# Altium footprint library PCBLIB.PcbLib: 557 footprints (part 19 of 36)
Each footprint in its own frame and in the unit in brackets; x right, y up, seen from the top. Pads: shape width x height; smd on the part's side, far side on the other; paste and mask are expansions set on the pad; w line width, h text height; cw(c..) or ccw(c..) is an arc to the next point about the centre after c.
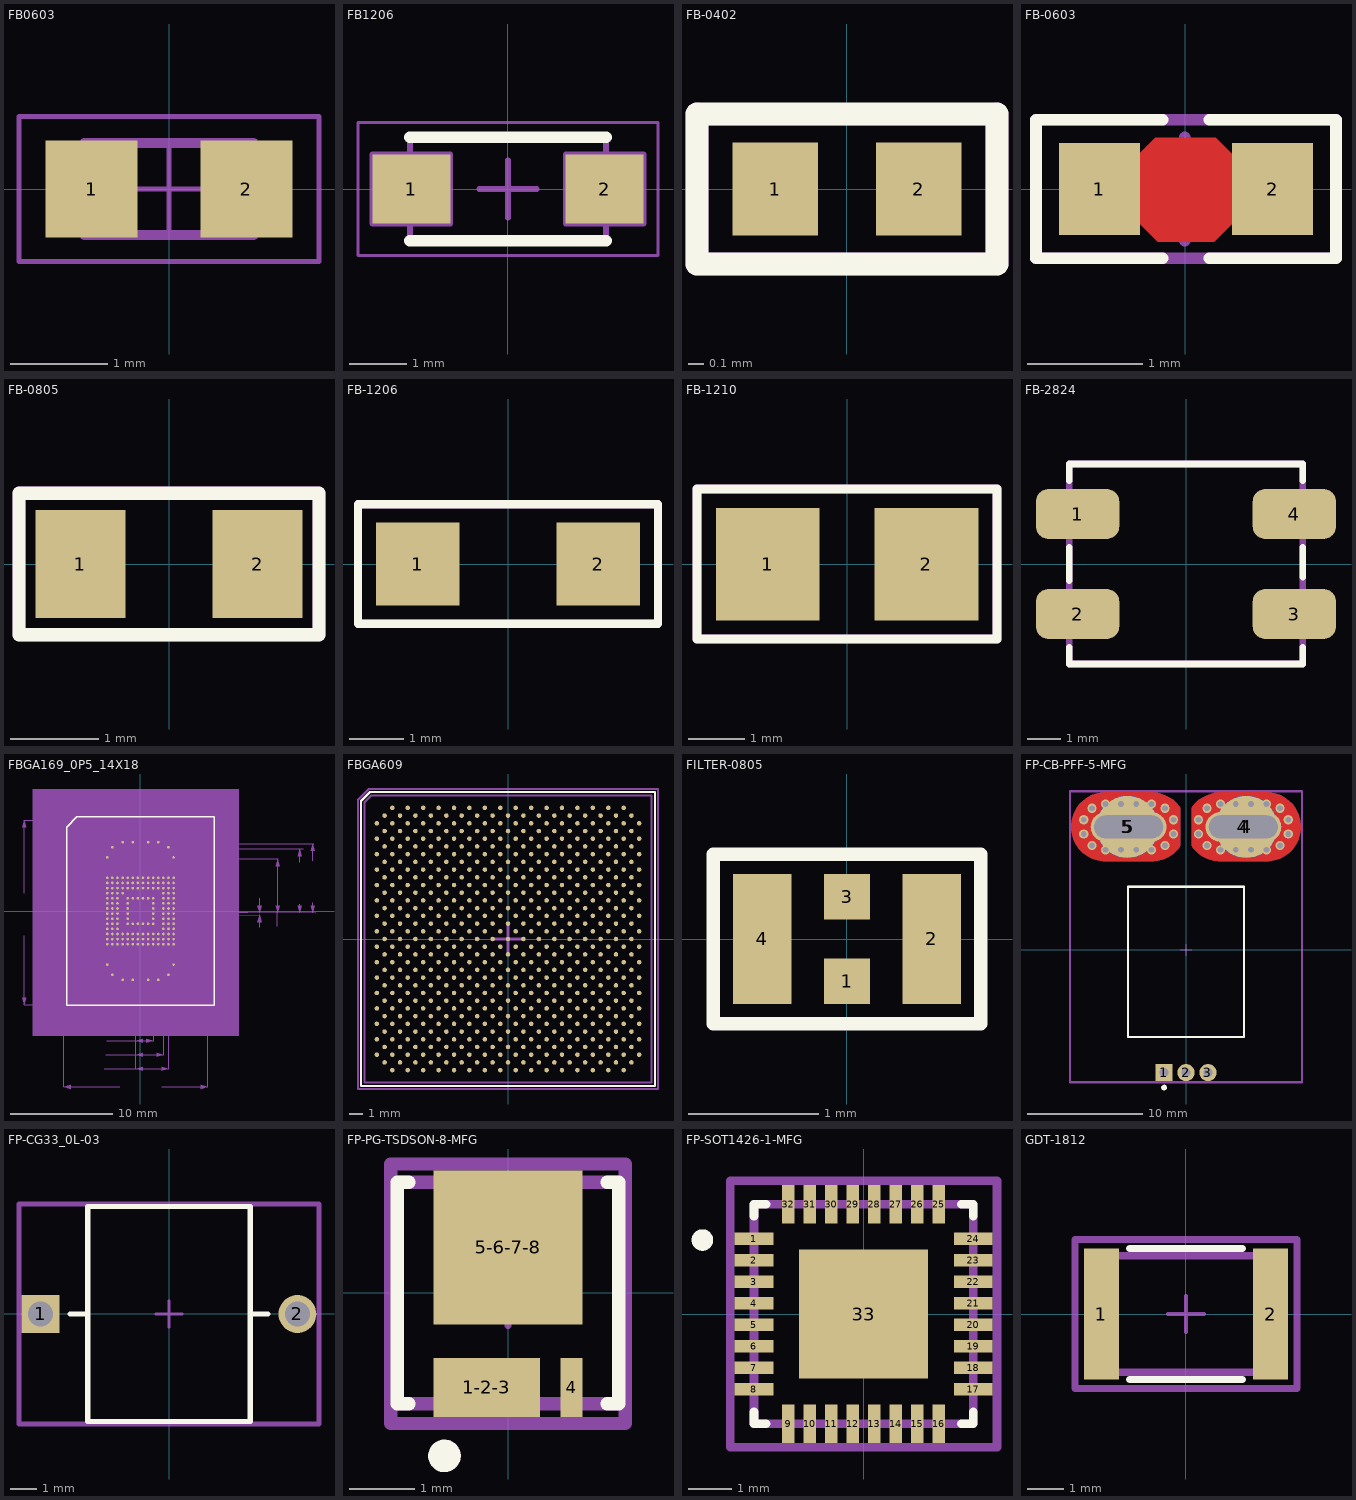
[diagram p18: the footprints below, top view; thin cyan lines are the x and y axes]

## FB0603 [mm] "Chip Inductor, 2-Leads, EIA 0603, Metric 1608, Body 1.6x0.8mm, IPC Medium Density"
height 0.95
pads (2):
  rect 0.95x1 smd: 1(-0.8,0) 2(0.8,0)
Mechanical 14:
  lines w0.1: -0.875,-0.475 -0.875,0.475 0.875,0.475 0.875,-0.475 -0.875,-0.475
Mechanical 15:
  lines w0.05: -0.5,0 0.5,0 ; 0,-0.5 0,0.5 ; -1.55,-0.75 -1.55,0.75 1.55,0.75 1.55,-0.75 -1.55,-0.75
3D body "INDC1608X95N.stp": height 0.95, standoff -0.05, extent -0.875,-0.475 0.875,0.475

## FB1206 [mm] "Chip Ferrite Bead, 3.20mm L X 1.60mm W, BLM31PG Series"
height 1.3
pads (2):
  rect 1.35x1.2 smd: 1(-1.675,0) 2(1.675,0)
Top Overlay:
  lines w0.2: -1.7,-0.9 1.7,-0.9 ; -1.7,0.9 1.7,0.9
Mechanical 8:
  lines w0.1: -2.175,0 -1.675,0 ; -1.675,-0.5 -1.675,0 ; -1.675,0.5 -1.675,0 ; -1.175,0 -1.675,0 ; -0.5,0 0,0 ; 0,-0.5 0,0 ; 0,0.5 0,0 ; 0.5,0 0,0 ; 1.175,0 1.675,0 ; 1.675,-0.5 1.675,0 ; 1.675,0.5 1.675,0 ; 2.175,0 1.675,0 ; -2.35,-0.6 -2.35,0.6 -1,0.6 -1,-0.6 -2.35,-0.6 ; 1,-0.6 1,0.6 2.35,0.6 2.35,-0.6 1,-0.6
Mechanical 14:
  lines w0.1: -1.7,-0.9 1.7,-0.9 1.7,0.9 -1.7,0.9 -1.7,-0.9
Mechanical 15:
  lines w0.05: -2.6,-1.15 2.6,-1.15 2.6,1.15 -2.6,1.15 -2.6,-1.15
3D body "IND_MURATA_BLM31PG.stp": height 1.3, standoff 0, extent -1.6,-0.8 1.6,0.8

## FB-0402 [mm]
pads (2):
  rect 0.57x0.62 smd mask+0.05: 1(-0.48,0) 2(0.48,0)
Top Overlay:
  lines w0.152: -1,-0.5 -1,0.5 1,0.5 1,-0.5 -1,-0.5
ASM Top:
  lines w0.15: -1,0.5 1,0.5
  lines w0.152: -1,0.5 -1,-0.5 1,-0.5 1,0.5
  text ".designator" at 0,0 h0.8
3D body "C_0402.step": height 0.5, standoff 0, extent -0.5,-0.25 0.5,0.25

## FB-0603 [mm]
pads (2):
  rect 0.7x0.8 smd: 1(-0.744,0) 2(0.756,0)
Top Layer:
  pour cut-out: -0.262,0.444 -0.394,0.311 -0.394,-0.3 -0.238,-0.456 0.249,-0.456 0.406,-0.3 0.406,0.3 0.262,0.444
Top Overlay:
  lines w0.1: -0.194,-0.6 -1.294,-0.6 -1.294,0.6 -0.194,0.6 ; 0.206,-0.6 1.306,-0.6 1.306,0.6 0.206,0.6
Mechanical 15:
  lines w0.1: -0.45,0 0.45,0 ; -0.006,-0.45 -0.006,0.45
ASM Top:
  lines w0.1: -1.294,-0.6 1.306,-0.6 1.306,0.6 -1.294,0.6 -1.294,-0.6
  text ".designator" at -0.006,-0.08 h0.8
3D body "C_0603.step": height 0.78, standoff 0, extent -0.8,-0.405 0.8,0.405

## FB-0805 [mil]
pads (2):
  rect 40x48 smd mask+1.97: 1(-39.5,0) 2(39.5,0)
Top Overlay:
  lines w6: -66.93,-31.5 -66.93,31.5 66.93,31.5 66.93,-31.5 -66.93,-31.5
ASM Top:
  lines w6: -66.93,-31.5 66.93,-31.5 66.93,31.5 -66.93,31.5 -66.93,-31.5
  text ".designator" at -55,-20 h31.5
3D body "C_0805.step": height 30.71, standoff 0, extent -40.36,-24.6 38.38,24.61

## FB-1206 [mil]
pads (2):
  rect 60x60 smd mask+1.97: 1(-65,0) 2(65,0)
Top Overlay:
  lines w6: -108,-43 -108,43 108,43 108,-43 -108,-43
ASM Top:
  lines w6: -108,-43 -108,43 108,43 108,-43 -108,-43
  text ".designator" at -90,-25 h31.5
3D body "C_1206.step": height 30.71, standoff 0, extent -62.03,-29.91 58.04,29.93

## FB-1210 [mil]
pads (2):
  rect 72x78 smd mask+1.97: 1(-55,0) 2(55,0)
Top Overlay:
  lines w6: -104,-52 -104,52 104,52 104,-52 -104,-52
ASM Top:
  lines w6: -104,-52 104,-52 104,52 -104,52 -104,-52
  text ".designator" at -86,-33 h31.5
3D body "C_1210.step": height 98.43, standoff 0, extent -62.99,-49 62.99,49.43

## FB-2824 [mm]
pads (4):
  rrect50% 2.5x1.5 smd: 1(-3.25,1.5) 2(-3.25,-1.5) 3(3.25,-1.5) 4(3.25,1.5)
Top Overlay:
  lines w0.2: -3.5,-2.5 -3.5,-3 3.5,-3 3.5,-2.5 ; -3.5,-0.5 -3.5,-0.4 -3.5,0.5 ; -3.5,2.5 -3.5,3 3.5,3 3.5,2.5 ; 3.5,-0.4 3.5,0.5
ASM Top:
  lines w0.2: -3.5,-3 -3.5,3 3.5,3 3.5,-3 -3.5,-3 ; -3.5,-3 -3.5,-3
  text ".designator" at -0.9,0 h0.8
3D body "acm7060.step": height 3.36, standoff 0.01, extent -3.5,-3 3.5,3

## FBGA169_0P5_14X18 [mil] "FBGA169_0P5_14X18"
pads (169):
  round 10 smd: A4(-68.9,265.75) A6(-29.53,265.75) A9(29.53,265.75) A11(68.9,265.75) AA1(-127.95,-127.95) AA2(-108.27,-127.95) AA3(-88.58,-127.95) AA4(-68.9,-127.95) AA5(-49.21,-127.95) AA6(-29.53,-127.95) AA7(-9.84,-127.95) AA8(9.84,-127.95) AA9(29.53,-127.95) AA10(49.21,-127.95) AA11(68.9,-127.95) AA12(88.58,-127.95) AA13(108.27,-127.95) AA14(127.95,-127.95) AE1(-127.95,-206.69) AE14(127.95,-206.69) AG2(-108.27,-246.06) AG13(108.27,-246.06) AH4(-68.9,-265.75) AH6(-29.53,-265.75) AH9(29.53,-265.75) AH11(68.9,-265.75) B2(-108.27,246.06) B13(108.27,246.06) D1(-127.95,206.69) D14(127.95,206.69) H1(-127.95,127.95) H2(-108.27,127.95) H3(-88.58,127.95) H4(-68.9,127.95) H5(-49.21,127.95) H6(-29.53,127.95) H7(-9.84,127.95) H8(9.84,127.95) H9(29.53,127.95) H10(49.21,127.95) H11(68.9,127.95) H12(88.58,127.95) H13(108.27,127.95) H14(127.95,127.95) J1(-127.95,108.27) J2(-108.27,108.27) J3(-88.58,108.27) J4(-68.9,108.27) J5(-49.21,108.27) J6(-29.53,108.27) J7(-9.84,108.27) J8(9.84,108.27) J9(29.53,108.27) J10(49.21,108.27) J11(68.9,108.27) J12(88.58,108.27) J13(108.27,108.27) J14(127.95,108.27) K1(-127.95,88.58) K2(-108.27,88.58) K3(-88.58,88.58) K4(-68.9,88.58) K5(-49.21,88.58) K6(-29.53,88.58) K7(-9.84,88.58) K8(9.84,88.58) K9(29.53,88.58) K10(49.21,88.58) K11(68.9,88.58) K12(88.58,88.58) K13(108.27,88.58) K14(127.95,88.58) L1(-127.95,68.9) L2(-108.27,68.9) L3(-88.58,68.9) L4(-68.9,68.9) L12(88.58,68.9) L13(108.27,68.9) L14(127.95,68.9) M1(-127.95,49.21) M2(-108.27,49.21) M3(-88.58,49.21) M5(-49.21,49.21) M6(-29.53,49.21) M7(-9.84,49.21) M8(9.84,49.21) M9(29.53,49.21) M10(49.21,49.21) M12(88.58,49.21) M13(108.27,49.21) M14(127.95,49.21) N1(-127.95,29.53) N2(-108.27,29.53) N3(-88.58,29.53) N5(-49.21,29.53) N10(49.21,29.53) N12(88.58,29.53) N13(108.27,29.53) N14(127.95,29.53) P1(-127.95,9.84) P2(-108.27,9.84) P3(-88.58,9.84) P5(-49.21,9.84) P10(49.21,9.84) P12(88.58,9.84) P13(108.27,9.84) P14(127.95,9.84) R1(-127.95,-9.84) R2(-108.27,-9.84) R3(-88.58,-9.84) R5(-49.21,-9.84) R10(49.21,-9.84) R12(88.58,-9.84) R13(108.27,-9.84) R14(127.95,-9.84) T1(-127.95,-29.53) T2(-108.27,-29.53) T3(-88.58,-29.53) T5(-49.21,-29.53) T10(49.21,-29.53) T12(88.58,-29.53) T13(108.27,-29.53) T14(127.95,-29.53) U1(-127.95,-49.21) U2(-108.27,-49.21) U3(-88.58,-49.21) U5(-49.21,-49.21) U6(-29.53,-49.21) U7(-9.84,-49.21) U8(9.84,-49.21) U9(29.53,-49.21) U10(49.21,-49.21) U12(88.58,-49.21) U13(108.27,-49.21) U14(127.95,-49.21) V1(-127.95,-68.9) V2(-108.27,-68.9) V3(-88.58,-68.9) V12(88.58,-68.9) V13(108.27,-68.9) V14(127.95,-68.9) W1(-127.95,-88.58) W2(-108.27,-88.58) W3(-88.58,-88.58) W4(-68.9,-88.58) W5(-49.21,-88.58) W6(-29.53,-88.58) W7(-9.84,-88.58) W8(9.84,-88.58) W9(29.53,-88.58) W10(49.21,-88.58) W11(68.9,-88.58) W12(88.58,-88.58) W13(108.27,-88.58) W14(127.95,-88.58) Y1(-127.95,-108.27) Y2(-108.27,-108.27) Y3(-88.58,-108.27) Y4(-68.9,-108.27) Y5(-49.21,-108.27) Y6(-29.53,-108.27) Y7(-9.84,-108.27) Y8(9.84,-108.27) Y9(29.53,-108.27) Y10(49.21,-108.27) Y11(68.9,-108.27) Y12(88.58,-108.27) Y13(108.27,-108.27) Y14(127.95,-108.27)
Top Overlay:
  lines w5: -284.56,-363.3 -284.57,323.93 -245.2,363.3 284.56,363.3 284.56,-363.31 -284.56,-363.3
Bottom 3D Body (Mech9):
  lines w1: -28.16,-5.5 -8.08,-5.5 ; -18.12,-15.54 -18.12,4.54
Mechanical 15:
  circle w6: c-244.88,306.5 r19.64
  lines w6: -277.56,-356.3 277.56,-356.3 277.56,356.3 -238.19,356.3 -277.56,316.93 -277.56,-356.3
Mechanical 45:
  pour cut-out: 379.44,470.8 -415.68,470.8 -415.68,-481.8 379.44,-481.8
Mechanical 46:
  text "T10" at -79.33,24.03 h10
  text "U9" at -55.65,43.71 h10
  text "M6" at 3.41,-54.71 h10
  text "N5" at 23.09,-35.03 h10
  text "AA5" at 19.09,122.45 h10
  text "AA3" at 58.46,122.45 h10
  text "Y4" at 42.78,102.77 h10
  text "W4" at 42.78,83.08 h10
  text "K6" at 3.41,-94.08 h10
  text "J6" at 3.41,-113.77 h10
  text "W5" at 23.09,83.08 h10
  text "K2" at 82.15,-94.08 h10
  text "H3" at 62.46,-133.45 h10
  text "R5" at 23.09,4.34 h10
  text "H4" at 42.78,-133.45 h10
  text "H5" at 23.09,-133.45 h10
  text "J2" at 82.15,-113.77 h10
  text "J3" at 62.46,-113.77 h10
  text "J4" at 42.78,-113.77 h10
  text "W6" at 3.41,83.08 h10
  text "J5" at 23.09,-113.77 h10
  text "Y5" at 23.09,102.77 h10
  text "T5" at 23.09,24.03 h10
  text "P5" at 23.09,-15.34 h10
  text "M7" at -16.28,-54.71 h10
  text "R10" at -79.33,4.34 h10
  text "U8" at -35.96,43.71 h10
  text "K4" at 42.78,-94.08 h10
  text "H6" at 3.41,-133.45 h10
  text "Y2" at 82.15,102.77 h10
  text "AA6" at -0.59,122.45 h10
  text "AA4" at 38.78,122.45 h10
  text "U7" at -16.28,43.71 h10
  text "U6" at 3.41,43.71 h10
  text "U10" at -79.33,43.71 h10
  text "P3" at 62.46,-15.34 h10
  text "P10" at -79.33,-15.34 h10
  text "N10" at -79.33,-35.03 h10
  text "M9" at -55.65,-54.71 h10
  text "M8" at -35.96,-54.71 h10
  text "M5" at 23.09,-54.71 h10
  text "M10" at -79.33,-54.71 h10
  text "K5" at 23.09,-94.08 h10
  text "H7" at -16.28,-133.45 h10
  text "AA10" at -83.33,122.45 h10
  text "Y9" at -55.65,102.77 h10
  text "Y8" at -35.96,102.77 h10
  text "Y7" at -16.28,102.77 h10
  text "Y6" at 3.41,102.77 h10
  text "Y3" at 62.46,102.77 h10
  text "Y14" at -158.07,102.77 h10
  text "Y13" at -138.39,102.77 h10
  text "Y12" at -118.7,102.77 h10
  text "Y11" at -99.02,102.77 h10
  text "Y10" at -79.33,102.77 h10
  text "Y1" at 101.83,102.77 h10
  text "W9" at -55.65,83.08 h10
  text "W8" at -35.96,83.08 h10
  text "W7" at -16.28,83.08 h10
  text "W3" at 62.46,83.08 h10
  text "W2" at 82.15,83.08 h10
  text "W14" at -158.07,83.08 h10
  text "W13" at -138.39,83.08 h10
  text "W12" at -118.7,83.08 h10
  text "W11" at -99.02,83.08 h10
  text "W10" at -79.33,83.08 h10
  text "W1" at 101.83,83.08 h10
  text "V3" at 62.46,63.4 h10
  text "V2" at 82.15,63.4 h10
  text "V14" at -158.07,63.4 h10
  text "V13" at -138.39,63.4 h10
  text "V12" at -118.7,63.4 h10
  text "V1" at 101.83,63.4 h10
  text "U3" at 62.46,43.71 h10
  text "U2" at 82.15,43.71 h10
  text "U14" at -158.07,43.71 h10
  text "U13" at -138.39,43.71 h10
  text "U12" at -118.7,43.71 h10
  text "U1" at 101.83,43.71 h10
  text "T3" at 62.46,24.03 h10
  text "T2" at 82.15,24.03 h10
  text "T14" at -158.07,24.03 h10
  text "T13" at -138.39,24.03 h10
  text "T12" at -118.7,24.03 h10
  text "T1" at 101.83,24.03 h10
  text "R3" at 62.46,4.34 h10
  text "R2" at 82.15,4.34 h10
  text "R14" at -158.07,4.34 h10
  text "R13" at -138.39,4.34 h10
  text "R12" at -118.7,4.34 h10
  text "R1" at 101.83,4.34 h10
  text "P2" at 82.15,-15.34 h10
  text "P14" at -158.07,-15.34 h10
  text "P13" at -138.39,-15.34 h10
  text "P12" at -118.7,-15.34 h10
  text "P1" at 101.83,-15.34 h10
  text "N3" at 62.46,-35.03 h10
  text "N2" at 82.15,-35.03 h10
  text "N14" at -158.07,-35.03 h10
  text "N13" at -138.39,-35.03 h10
  text "N12" at -118.7,-35.03 h10
  text "N1" at 101.83,-35.03 h10
  text "M3" at 62.46,-54.71 h10
  text "M2" at 82.15,-54.71 h10
  text "M14" at -158.07,-54.71 h10
  text "M13" at -138.39,-54.71 h10
  text "M12" at -118.7,-54.71 h10
  text "M1" at 101.83,-54.71 h10
  text "L4" at 42.78,-74.4 h10
  text "L3" at 62.46,-74.4 h10
  text "L2" at 82.15,-74.4 h10
  text "L14" at -158.07,-74.4 h10
  text "L13" at -138.39,-74.4 h10
  text "L12" at -118.7,-74.4 h10
  text "L1" at 101.83,-74.4 h10
  text "K9" at -55.65,-94.08 h10
  text "K8" at -35.96,-94.08 h10
  text "K7" at -16.28,-94.08 h10
  text "K3" at 62.46,-94.08 h10
  text "K14" at -158.07,-94.08 h10
  text "K13" at -138.39,-94.08 h10
  text "K12" at -118.7,-94.08 h10
  text "K11" at -99.02,-94.08 h10
  text "K10" at -79.33,-94.08 h10
  text "K1" at 101.83,-94.08 h10
  text "J9" at -55.65,-113.77 h10
  text "J8" at -35.96,-113.77 h10
  text "J7" at -16.28,-113.77 h10
  text "J14" at -158.07,-113.77 h10
  text "J13" at -138.39,-113.77 h10
  text "J12" at -118.7,-113.77 h10
  text "J11" at -99.02,-113.77 h10
  text "J10" at -79.33,-113.77 h10
  text "J1" at 101.83,-113.77 h10
  text "H9" at -55.65,-133.45 h10
  text "H8" at -35.96,-133.45 h10
  text "H2" at 82.15,-133.45 h10
  text "H14" at -158.07,-133.45 h10
  text "H13" at -138.39,-133.45 h10
  text "H12" at -118.7,-133.45 h10
  text "H11" at -99.02,-133.45 h10
  text "H10" at -79.33,-133.45 h10
  text "H1" at 101.83,-133.45 h10
  text "D14" at -158.07,-212.19 h10
  text "D1" at 101.83,-212.19 h10
  text "B2" at 82.15,-251.56 h10
  text "B13" at -138.39,-251.56 h10
  text "AH9" at -59.65,260.25 h10
  text "AH6" at -0.59,260.25 h10
  text "AH4" at 38.78,260.25 h10
  text "AH11" at -103.02,260.25 h10
  text "AG2" at 78.15,240.56 h10
  text "AG13" at -142.39,240.56 h10
  text "AE14" at -162.07,201.19 h10
  text "AE1" at 97.83,201.19 h10
  text "AA9" at -59.65,122.45 h10
  text "AA8" at -39.96,122.45 h10
  text "AA7" at -20.28,122.45 h10
  text "AA2" at 78.15,122.45 h10
  text "AA14" at -162.07,122.45 h10
  text "AA13" at -142.39,122.45 h10
  text "AA12" at -122.7,122.45 h10
  text "AA11" at -103.02,122.45 h10
  text "AA1" at 97.83,122.45 h10
  text "A9" at -55.65,-271.25 h10
  text "A6" at 3.41,-271.25 h10
  text "A4" at 42.78,-271.25 h10
  text "A11" at -99.02,-271.25 h10
  text "U5" at 23.09,43.71 h10
Mechanical 67:
  circle w6: c226.76,-312 r19.64
  lines w6: -63.28,-416.25 -63.28,-391.56 ; 32.75,-419.67 32.75,-394.99 ; 281.17,-103.45 305.86,-103.45 ; 281.17,98.87 305.86,98.87 ; 281.64,197.49 306.33,197.49 ; 282.08,-197.43 306.76,-197.43 ; 282.08,-2.98 306.76,-2.98 ; -295.68,-361.8 220.07,-361.8 259.44,-322.43 259.44,350.8 -295.68,350.8 -295.68,-361.8
  text "U53" at -36.4,-8.44 h20
  text "A" at 289.79,-274.48 h20
  text "AH" at 288.01,280.84 h20
  text "1" at 118.45,-389.16 h20
  text "14" at -139.69,-387.43 h20
Mechanical 106:
  pour cut-out: 231.88,-686.72 259.44,-678.85 231.88,-670.97
  pour cut-out: -268.12,-670.97 -295.68,-678.85 -268.12,-686.72
  pour cut-out: 82.27,-616.64 109.83,-608.77 82.27,-600.89
  pour cut-out: 9.44,-600.89 -18.12,-608.77 9.44,-616.64
  pour cut-out: 62.59,-561.96 90.15,-554.08 62.59,-546.21
  pour cut-out: 9.44,-546.21 -18.12,-554.08 9.44,-561.96
  pour cut-out: 23.22,-508.41 50.78,-500.54 23.22,-492.67
  pour cut-out: 9.44,-492.67 -18.12,-500.54 9.44,-508.41
  pour cut-out: 38.97,-436.8 11.41,-444.67 38.97,-452.55
  pour cut-out: -45.68,-452.55 -18.12,-444.67 -45.68,-436.8
  pour cut-out: 673.14,231.7 665.27,259.26 657.39,231.7
  pour cut-out: 657.39,21.07 665.27,-6.48 673.14,21.07
  pour cut-out: 621.92,212.02 614.05,239.58 606.17,212.02
  pour cut-out: 606.17,21.07 614.05,-6.48 621.92,21.07
  pour cut-out: 537.39,172.65 529.52,200.21 521.64,172.65
  pour cut-out: 521.64,21.07 529.52,-6.48 537.39,21.07
  pour cut-out: -440.29,323.24 -448.16,350.8 -456.03,323.24
  pour cut-out: -456.03,-334.24 -448.16,-361.8 -440.29,-334.24
  pour cut-out: -369.89,94.89 -377.77,122.45 -385.64,94.89
  pour cut-out: -385.64,-105.89 -377.77,-133.45 -369.89,-105.89
  pour cut-out: 451.6,21.07 459.48,-6.48 467.35,21.07
  pour cut-out: 467.35,-42.9 459.48,-15.34 451.6,-42.9
  pour cut-out: -338.2,150.01 -330.32,122.45 -322.45,150.01
  pour cut-out: -322.45,75.21 -330.32,102.77 -338.2,75.21
  lines w1: -448.16,-94.7 -448.16,-361.8 -295.68,-361.8 -295.68,-678.85 -80,-678.85 ; -448.16,67.8 -448.16,350.8 -295.68,350.8 ; -377.77,-92.88 -377.77,-133.45 -146.07,-133.45 ; -377.77,40.62 -377.77,122.45 -146.07,122.45 -330.32,122.45 -330.32,177.57 ; -330.32,28.96 -330.32,102.77 -146.07,102.77 ; -139.27,-608.77 -18.12,-608.77 ; -134.63,-554.08 -18.12,-554.08 ; -132.31,-444.67 -18.12,-444.67 -18.12,-5.5 ; -129.98,-500.54 -18.12,-500.54 ; 11.41,-271.25 11.41,-444.67 66.53,-444.67 ; 50.78,-271.25 50.78,-500.54 -18.12,-500.54 ; 50.78,260.25 669.6,259.38 ; 82.5,-678.85 259.44,-678.85 259.44,-361.8 ; 90.15,-251.56 90.15,-554.08 -18.12,-554.08 ; 90.15,240.56 628.1,239.62 ; 109.83,-212.19 109.83,-608.77 -18.12,-608.77 ; 109.83,-15.34 461.05,-16.37 ; 109.83,201.19 532.23,202.53 ; 356.68,-5.5 -18.12,-5.5 ; 413.89,-5.5 -18.12,-5.5 ; 459.48,-63.19 459.48,-15.34 ; 459.48,-6.48 459.48,48.63 ; 528.53,-58.43 528.53,-5.5 ; 529.52,-6.48 529.52,200.21 ; 614.05,-6.48 614.05,26.6 ; 614.05,189.09 614.05,239.58 ; 665.27,-6.48 665.27,31.36 ; 665.27,193.86 665.27,259.26 ; 676.53,-6.01 -18.12,-5.5 ; -18.12,-608.77 -18.12,-5.5 ; -18.12,-554.08 -18.12,-5.5 ; -18.12,-500.54 -18.12,-5.5
  text "14.1" at 56.25,-663.35 h20
  text "3.25" at -165.52,-593.27 h20
  text "2.75" at -160.88,-538.58 h20
  text "1.75" at -156.23,-485.04 h20
  text "0.75" at -158.55,-429.17 h20
  text "6.75" at 649.77,167.61 h20
  text "6.25" at 598.55,162.85 h20
  text "5.25" at 513.03,-84.67 h20
  text "18.1" at -463.66,41.55 h20
  text "6.5" at -393.27,14.37 h20
  text "0.25" at 437.35,-87.55 h20
  text "0.5" at -345.82,2.72 h20
  text "PADS C010S" at 138.93,453.79 h20
  text "ALL DIMS IN MM" at 143.38,501.11 h20
  text "FBGA169_0P5_14X18" at 216.92,-747.11 h20

## FBGA609 [mil] "0.8 mm pitch, 21 mm x 21 mm x 2.37 mm"
pads (609):
  round 13 smd mask+1.97: A3(-334.07,378.62) A5(-289.53,378.62) A7(-244.99,378.62) A9(-200.44,378.62) A11(-155.9,378.62) A13(-111.36,378.62) A15(-66.81,378.62) A17(-22.27,378.62) A19(22.27,378.62) A21(66.81,378.62) A23(111.36,378.62) A25(155.9,378.62) A27(200.44,378.62) A29(244.99,378.62) A31(289.53,378.62) A33(334.07,378.62) AA1(-378.62,-66.81) AA3(-334.07,-66.81) AA5(-289.53,-66.81) AA7(-244.99,-66.81) AA9(-200.44,-66.81) AA11(-155.9,-66.81) AA13(-111.36,-66.81) AA15(-66.81,-66.81) AA17(-22.27,-66.81) AA19(22.27,-66.81) AA21(66.81,-66.81) AA23(111.36,-66.81) AA25(155.9,-66.81) AA27(200.44,-66.81) AA29(244.99,-66.81) AA31(289.53,-66.81) AA33(334.07,-66.81) AA35(378.62,-66.81) AB2(-356.35,-89.09) AB4(-311.8,-89.09) AB6(-267.26,-89.09) AB8(-222.72,-89.09) AB10(-178.17,-89.09) AB12(-133.63,-89.09) AB14(-89.09,-89.09) AB16(-44.54,-89.09) AB18(0,-89.09) AB20(44.54,-89.09) AB22(89.09,-89.09) AB24(133.63,-89.09) AB26(178.17,-89.09) AB28(222.72,-89.09) AB30(267.26,-89.09) AB32(311.8,-89.09) AB34(356.35,-89.09) AC1(-378.62,-111.36) AC3(-334.07,-111.36) AC5(-289.53,-111.36) AC7(-244.99,-111.36) AC9(-200.44,-111.36) AC11(-155.9,-111.36) AC13(-111.36,-111.36) AC15(-66.81,-111.36) AC17(-22.27,-111.36) AC19(22.27,-111.36) AC21(66.81,-111.36) AC23(111.36,-111.36) AC25(155.9,-111.36) AC27(200.44,-111.36) AC29(244.99,-111.36) AC31(289.53,-111.36) AC33(334.07,-111.36) AC35(378.62,-111.36) AD2(-356.35,-133.63) AD4(-311.8,-133.63) AD6(-267.26,-133.63) AD8(-222.72,-133.63) AD10(-178.17,-133.63) AD12(-133.63,-133.63) AD14(-89.09,-133.63) AD16(-44.54,-133.63) AD18(0,-133.63) AD20(44.54,-133.63) AD22(89.09,-133.63) AD24(133.63,-133.63) AD26(178.17,-133.63) AD28(222.72,-133.63) AD30(267.26,-133.63) AD32(311.8,-133.63) AD34(356.35,-133.63) AE1(-378.62,-155.9) AE3(-334.07,-155.9) AE5(-289.53,-155.9) AE7(-244.99,-155.9) AE9(-200.44,-155.9) AE11(-155.9,-155.9) AE13(-111.36,-155.9) AE15(-66.81,-155.9) AE17(-22.27,-155.9) AE19(22.27,-155.9) AE21(66.81,-155.9) AE23(111.36,-155.9) AE25(155.9,-155.9) AE27(200.44,-155.9) AE29(244.99,-155.9) AE31(289.53,-155.9) AE33(334.07,-155.9) AE35(378.62,-155.9) AF2(-356.35,-178.17) AF4(-311.8,-178.17) AF6(-267.26,-178.17) AF8(-222.72,-178.17) AF10(-178.17,-178.17) AF12(-133.63,-178.17) AF14(-89.09,-178.17) AF16(-44.54,-178.17) AF18(0,-178.17) AF20(44.54,-178.17) AF22(89.09,-178.17) AF24(133.63,-178.17) AF26(178.17,-178.17) AF28(222.72,-178.17) AF30(267.26,-178.17) AF32(311.8,-178.17) AF34(356.35,-178.17) AG1(-378.62,-200.44) AG3(-334.07,-200.44) AG5(-289.53,-200.44) AG7(-244.99,-200.44) AG9(-200.44,-200.44) AG11(-155.9,-200.44) AG13(-111.36,-200.44) AG15(-66.81,-200.44) AG17(-22.27,-200.44) AG19(22.27,-200.44) AG21(66.81,-200.44) AG23(111.36,-200.44) AG25(155.9,-200.44) AG27(200.44,-200.44) AG29(244.99,-200.44) AG31(289.53,-200.44) AG33(334.07,-200.44) AG35(378.62,-200.44) AH2(-356.35,-222.72) AH4(-311.8,-222.72) AH6(-267.26,-222.72) AH8(-222.72,-222.72) AH10(-178.17,-222.72) AH12(-133.63,-222.72) AH14(-89.09,-222.72) AH16(-44.54,-222.72) AH18(0,-222.72) AH20(44.54,-222.72) AH22(89.09,-222.72) AH24(133.63,-222.72) AH26(178.17,-222.72) AH28(222.72,-222.72) AH30(267.26,-222.72) AH32(311.8,-222.72) AH34(356.35,-222.72) AJ1(-378.62,-244.99) AJ3(-334.07,-244.99) AJ5(-289.53,-244.99) AJ7(-244.99,-244.99) AJ9(-200.44,-244.99) AJ11(-155.9,-244.99) AJ13(-111.36,-244.99) AJ15(-66.81,-244.99) AJ17(-22.27,-244.99) AJ19(22.27,-244.99) AJ21(66.81,-244.99) AJ23(111.36,-244.99) AJ25(155.9,-244.99) AJ27(200.44,-244.99) AJ29(244.99,-244.99) AJ31(289.53,-244.99) AJ33(334.07,-244.99) AJ35(378.62,-244.99) AK2(-356.35,-267.26) AK4(-311.8,-267.26) AK6(-267.26,-267.26) AK8(-222.72,-267.26) AK10(-178.17,-267.26) AK12(-133.63,-267.26) AK14(-89.09,-267.26) AK16(-44.54,-267.26) AK18(0,-267.26) AK20(44.54,-267.26) AK22(89.09,-267.26) AK24(133.63,-267.26) AK26(178.17,-267.26) AK28(222.72,-267.26) AK30(267.26,-267.26) AK32(311.8,-267.26) AK34(356.35,-267.26) AL1(-378.62,-289.53) AL3(-334.07,-289.53) AL5(-289.53,-289.53) AL7(-244.99,-289.53) AL9(-200.44,-289.53) AL11(-155.9,-289.53) AL13(-111.36,-289.53) AL15(-66.81,-289.53) AL17(-22.27,-289.53) AL19(22.27,-289.53) AL21(66.81,-289.53) AL23(111.36,-289.53) AL25(155.9,-289.53) AL27(200.44,-289.53) AL29(244.99,-289.53) AL31(289.53,-289.53) AL33(334.07,-289.53) AL35(378.62,-289.53) AM2(-356.35,-311.8) AM4(-311.8,-311.8) AM6(-267.26,-311.8) AM8(-222.72,-311.8) AM10(-178.17,-311.8) AM12(-133.63,-311.8) AM14(-89.09,-311.8) AM16(-44.54,-311.8) AM18(0,-311.8) AM20(44.54,-311.8) AM22(89.09,-311.8) AM24(133.63,-311.8) AM26(178.17,-311.8) AM28(222.72,-311.8) AM30(267.26,-311.8) AM32(311.8,-311.8) AM34(356.35,-311.8) AN1(-378.62,-334.07) AN3(-334.07,-334.07) AN5(-289.53,-334.07) AN7(-244.99,-334.07) AN9(-200.44,-334.07) AN11(-155.9,-334.07) AN13(-111.36,-334.07) AN15(-66.81,-334.07) AN17(-22.27,-334.07) AN19(22.27,-334.07) AN21(66.81,-334.07) AN23(111.36,-334.07) AN25(155.9,-334.07) AN27(200.44,-334.07) AN29(244.99,-334.07) AN31(289.53,-334.07) AN33(334.07,-334.07) AN35(378.62,-334.07) AP2(-356.35,-356.35) AP4(-311.8,-356.35) AP6(-267.26,-356.35) AP8(-222.72,-356.35) AP10(-178.17,-356.35) AP12(-133.63,-356.35) AP14(-89.09,-356.35) AP16(-44.54,-356.35) AP18(0,-356.35) AP20(44.54,-356.35) AP22(89.09,-356.35) AP24(133.63,-356.35) AP26(178.17,-356.35) AP28(222.72,-356.35) AP30(267.26,-356.35) AP32(311.8,-356.35) AP34(356.35,-356.35) AR3(-334.07,-378.62) AR5(-289.53,-378.62) AR7(-244.99,-378.62) AR9(-200.44,-378.62) AR11(-155.9,-378.62) AR13(-111.36,-378.62) AR15(-66.81,-378.62) AR17(-22.27,-378.62) AR19(22.27,-378.62) AR21(66.81,-378.62) AR23(111.36,-378.62) AR25(155.9,-378.62) AR27(200.44,-378.62) AR29(244.99,-378.62) AR31(289.53,-378.62) AR33(334.07,-378.62) B2(-356.35,356.35) B4(-311.8,356.35) B6(-267.26,356.35) B8(-222.72,356.35) B10(-178.17,356.35) B12(-133.63,356.35) B14(-89.09,356.35) B16(-44.54,356.35) B18(0,356.35) B20(44.54,356.35) B22(89.09,356.35) B24(133.63,356.35) B26(178.17,356.35) B28(222.72,356.35) B30(267.26,356.35) B32(311.8,356.35) B34(356.35,356.35) C1(-378.62,334.07) C3(-334.07,334.07) C5(-289.53,334.07) C7(-244.99,334.07) C9(-200.44,334.07) C11(-155.9,334.07) C13(-111.36,334.07) C15(-66.81,334.07) C17(-22.27,334.07) C19(22.27,334.07) C21(66.81,334.07) C23(111.36,334.07) C25(155.9,334.07) C27(200.44,334.07) C29(244.99,334.07) C31(289.53,334.07) C33(334.07,334.07) C35(378.62,334.07) D2(-356.35,311.8) D4(-311.8,311.8) D6(-267.26,311.8) D8(-222.72,311.8) D10(-178.17,311.8) D12(-133.63,311.8) D14(-89.09,311.8) D16(-44.54,311.8) D18(0,311.8) D20(44.54,311.8) D22(89.09,311.8) D24(133.63,311.8) D26(178.17,311.8) D28(222.72,311.8) D30(267.26,311.8) D32(311.8,311.8) D34(356.35,311.8) E1(-378.62,289.53) E3(-334.07,289.53) E5(-289.53,289.53) E7(-244.99,289.53) E9(-200.44,289.53) E11(-155.9,289.53) E13(-111.36,289.53) E15(-66.81,289.53) E17(-22.27,289.53) E19(22.27,289.53) E21(66.81,289.53) E23(111.36,289.53) E25(155.9,289.53) E27(200.44,289.53) E29(244.99,289.53) E31(289.53,289.53) E33(334.07,289.53) E35(378.62,289.53) F2(-356.35,267.26) F4(-311.8,267.26) F6(-267.26,267.26) F8(-222.72,267.26) F10(-178.17,267.26) F12(-133.63,267.26) F14(-89.09,267.26) F16(-44.54,267.26) F18(0,267.26) F20(44.54,267.26) F22(89.09,267.26) F24(133.63,267.26) F26(178.17,267.26) F28(222.72,267.26) F30(267.26,267.26) F32(311.8,267.26) F34(356.35,267.26) G1(-378.62,244.99) G3(-334.07,244.99) G5(-289.53,244.99) G7(-244.99,244.99) G9(-200.44,244.99) G11(-155.9,244.99) G13(-111.36,244.99) G15(-66.81,244.99) G17(-22.27,244.99) G19(22.27,244.99) G21(66.81,244.99) G23(111.36,244.99) G25(155.9,244.99) G27(200.44,244.99) G29(244.99,244.99) G31(289.53,244.99) G33(334.07,244.99) G35(378.62,244.99) H2(-356.35,222.72) H4(-311.8,222.72) H6(-267.26,222.72) H8(-222.72,222.72) H10(-178.17,222.72) H12(-133.63,222.72) H14(-89.09,222.72) H16(-44.54,222.72) H18(0,222.72) H20(44.54,222.72) H22(89.09,222.72) H24(133.63,222.72) H26(178.17,222.72) H28(222.72,222.72) H30(267.26,222.72) H32(311.8,222.72) H34(356.35,222.72) J1(-378.62,200.44) J3(-334.07,200.44) J5(-289.53,200.44) J7(-244.99,200.44) J9(-200.44,200.44) J11(-155.9,200.44) J13(-111.36,200.44) J15(-66.81,200.44) J17(-22.27,200.44) J19(22.27,200.44) J21(66.81,200.44) J23(111.36,200.44) J25(155.9,200.44) J27(200.44,200.44) J29(244.99,200.44) J31(289.53,200.44) J33(334.07,200.44) J35(378.62,200.44) K2(-356.35,178.17) K4(-311.8,178.17) K6(-267.26,178.17) K8(-222.72,178.17) K10(-178.17,178.17) K12(-133.63,178.17) K14(-89.09,178.17) K16(-44.54,178.17) K18(0,178.17) K20(44.54,178.17) K22(89.09,178.17) K24(133.63,178.17) K26(178.17,178.17) K28(222.72,178.17) K30(267.26,178.17) K32(311.8,178.17) K34(356.35,178.17) L1(-378.62,155.9) L3(-334.07,155.9) L5(-289.53,155.9) L7(-244.99,155.9) L9(-200.44,155.9) L11(-155.9,155.9) L13(-111.36,155.9) L15(-66.81,155.9) L17(-22.27,155.9) L19(22.27,155.9) L21(66.81,155.9) L23(111.36,155.9) L25(155.9,155.9) L27(200.44,155.9) L29(244.99,155.9) L31(289.53,155.9) L33(334.07,155.9) L35(378.62,155.9) M2(-356.35,133.63) M4(-311.8,133.63) M6(-267.26,133.63) M8(-222.72,133.63) M10(-178.17,133.63) M12(-133.63,133.63) M14(-89.09,133.63) M16(-44.54,133.63) M18(0,133.63) M20(44.54,133.63) M22(89.09,133.63) M24(133.63,133.63) M26(178.17,133.63) M28(222.72,133.63) M30(267.26,133.63) M32(311.8,133.63) M34(356.35,133.63) N1(-378.62,111.36) N3(-334.07,111.36) N5(-289.53,111.36) N7(-244.99,111.36) N9(-200.44,111.36) N11(-155.9,111.36) N13(-111.36,111.36) N15(-66.81,111.36) N17(-22.27,111.36) N19(22.27,111.36) N21(66.81,111.36) N23(111.36,111.36) N25(155.9,111.36) N27(200.44,111.36) N29(244.99,111.36) N31(289.53,111.36) N33(334.07,111.36) N35(378.62,111.36) P2(-356.35,89.09) P4(-311.8,89.09) P6(-267.26,89.09) P8(-222.72,89.09) P10(-178.17,89.09) P12(-133.63,89.09) P14(-89.09,89.09) P16(-44.54,89.09) P18(0,89.09) P20(44.54,89.09) P22(89.09,89.09) P24(133.63,89.09) P26(178.17,89.09) P28(222.72,89.09) P30(267.26,89.09) P32(311.8,89.09) P34(356.35,89.09) R1(-378.62,66.81) R3(-334.07,66.81) R5(-289.53,66.81) R7(-244.99,66.81) R9(-200.44,66.81) R11(-155.9,66.81) R13(-111.36,66.81) R15(-66.81,66.81) R17(-22.27,66.81) R19(22.27,66.81) R21(66.81,66.81) R23(111.36,66.81) R25(155.9,66.81) R27(200.44,66.81) R29(244.99,66.81) R31(289.53,66.81) R33(334.07,66.81) R35(378.62,66.81) T2(-356.35,44.54) T4(-311.8,44.54) T6(-267.26,44.54) T8(-222.72,44.54) T10(-178.17,44.54) T12(-133.63,44.54) T14(-89.09,44.54) T16(-44.54,44.54) T18(0,44.54) T20(44.54,44.54) T22(89.09,44.54) T24(133.63,44.54) T26(178.17,44.54) T28(222.72,44.54) T30(267.26,44.54) T32(311.8,44.54) T34(356.35,44.54) U1(-378.62,22.27) U3(-334.07,22.27) U5(-289.53,22.27) U7(-244.99,22.27) U9(-200.44,22.27) U11(-155.9,22.27) U13(-111.36,22.27) U15(-66.81,22.27) U17(-22.27,22.27) U19(22.27,22.27) U21(66.81,22.27) U23(111.36,22.27) U25(155.9,22.27) U27(200.44,22.27) U29(244.99,22.27) U31(289.53,22.27) U33(334.07,22.27) U35(378.62,22.27) V2(-356.35,0) V4(-311.8,0) V6(-267.26,0) V8(-222.72,0) V10(-178.17,0) V12(-133.63,0) V14(-89.09,0) V16(-44.54,0) V18(0,0) V20(44.54,0) V22(89.09,0) V24(133.63,0) V26(178.17,0) V28(222.72,0) V30(267.26,0) V32(311.8,0) V34(356.35,0) W1(-378.62,-22.27) W3(-334.07,-22.27) W5(-289.53,-22.27) W7(-244.99,-22.27) W9(-200.44,-22.27) W11(-155.9,-22.27) W13(-111.36,-22.27) W15(-66.81,-22.27) W17(-22.27,-22.27) W19(22.27,-22.27) W21(66.81,-22.27) W23(111.36,-22.27) W25(155.9,-22.27) W27(200.44,-22.27) W29(244.99,-22.27) W31(289.53,-22.27) W33(334.07,-22.27) W35(378.62,-22.27) Y2(-356.35,-44.54) Y4(-311.8,-44.54) Y6(-267.26,-44.54) Y8(-222.72,-44.54) Y10(-178.17,-44.54) Y12(-133.63,-44.54) Y14(-89.09,-44.54) Y16(-44.54,-44.54) Y18(0,-44.54) Y20(44.54,-44.54) Y22(89.09,-44.54) Y24(133.63,-44.54) Y26(178.17,-44.54) Y28(222.72,-44.54) Y30(267.26,-44.54) Y32(311.8,-44.54) Y34(356.35,-44.54)
Top Overlay:
  lines w6: -424.37,-424.37 -424.37,398.51 -398.51,424.37 424.37,424.37 424.37,-424.37 -424.37,-424.37
Mechanical 15:
  lines w6: -433.07,-433.07 -433.07,401.57 -401.57,433.07 433.07,433.07 433.07,-433.07 -433.07,-433.07
  lines w7.87: -44.54,0 0,0 0,44.54 ; -0.22,-44.38 -0.22,0.16 ; -0.22,0 44.32,0
ASM Top:
  lines w6: -414.37,-414.37 414.37,-414.37 414.37,414.37 -394.37,414.37 -414.37,394.37 -414.37,-414.37
  text ".designator" at -44.49,10.1 h59.06
3D body "MIMX8QX6AVLFZAC.stp": height 99.21, standoff 0, extent -413.61,-413.38 413.17,413.39

## FILTER-0805 [mm]
pads (4):
  rect 0.35x0.35 smd mask+0.051: 1(0,-0.325) 3(0,0.325)
  rect 0.45x1 smd mask+0.051: 2(0.65,0) 4(-0.65,0)
Top Overlay:
  lines w0.102: -1.025,-0.65 -1.025,0.65 1.025,0.65 1.025,-0.65 -1.025,-0.65
3D body "NFM21PC.STEP": height 0.87, standoff 0, extent -1,-0.66 1.02,0.61

## FP-CB-PFF-5-MFG [mm]
pads (9):
  rect 1.5x1.5 hole 0.8 paste-1000 mask+0: 1(-1.91,-10.7)
  round 1.5 hole 0.8 paste-1000 mask+0: 2(0,-10.7) 3(1.91,-10.7)
  rrect100% 6.6x2.6 hole 2 slot 6 at 0 deg paste-1000 mask+0: 4(5,10.7) 5(-5,10.7)
  round 5.4 smd paste-1000 mask+0: 4(5.25,10.7) 5(-5.099,10.7)
  round 5.4 smd far side paste-1000 mask+0: 4(5.25,10.7) 5(-5.099,10.7)
via -8.902,10.082 diameter 0.8 hole 0.5
via 8.902,10.082 diameter 0.8 hole 0.5
via 8.902,11.318 diameter 0.8 hole 0.5
via -8.902,11.318 diameter 0.8 hole 0.5
via -1.098,11.318 diameter 0.8 hole 0.5
via 1.098,11.318 diameter 0.8 hole 0.5
via 1.098,10.082 diameter 0.8 hole 0.5
via -1.098,10.082 diameter 0.8 hole 0.5
via -8.176,12.318 diameter 0.8 hole 0.5
via 8.176,12.318 diameter 0.8 hole 0.5
via 8.176,9.082 diameter 0.8 hole 0.5
via -8.176,9.082 diameter 0.8 hole 0.5
via -1.824,9.082 diameter 0.8 hole 0.5
via 1.824,9.082 diameter 0.8 hole 0.5
via 1.824,12.318 diameter 0.8 hole 0.5
via -1.824,12.318 diameter 0.8 hole 0.5
via -7,12.7 diameter 0.8 hole 0.5
via 7,12.7 diameter 0.8 hole 0.5
via 7,8.7 diameter 0.8 hole 0.5
via -7,8.7 diameter 0.8 hole 0.5
via -3,8.7 diameter 0.8 hole 0.5
via 3,8.7 diameter 0.8 hole 0.5
via 3,12.7 diameter 0.8 hole 0.5
via -3,12.7 diameter 0.8 hole 0.5
via -4.333,12.7 diameter 0.8 hole 0.5
via 4.333,12.7 diameter 0.8 hole 0.5
via 4.333,8.7 diameter 0.8 hole 0.5
via -4.333,8.7 diameter 0.8 hole 0.5
via -5.667,8.7 diameter 0.8 hole 0.5
via -5.667,12.7 diameter 0.8 hole 0.5
via 5.667,12.7 diameter 0.8 hole 0.5
via 5.667,8.7 diameter 0.8 hole 0.5
Top Layer:
  region: -0.5,9.042 -0.602,8.888 -0.843,8.607 -1.116,8.358 -1.418,8.144 -1.744,7.969 -2.089,7.836 -2.448,7.745 -2.815,7.7 -3,7.7 -7,7.7 -7.236,7.7 -7.703,7.774 -8.152,7.92 -8.572,8.134 -8.954,8.412 -9.288,8.746 -9.566,9.128 -9.78,9.548 -9.926,9.997 -10,10.464 -10,10.936 -9.926,11.402 -9.78,11.852 -9.566,12.272 -9.288,12.654 -8.954,12.988 -8.572,13.266 -8.152,13.48 -7.703,13.626 -7.236,13.7 -7,13.7 -3,13.7 -2.815,13.7 -2.448,13.655 -2.089,13.564 -1.744,13.431 -1.418,13.256 -1.116,13.042 -0.843,12.793 -0.602,12.512 -0.5,12.358
  region: 0.501,9.042 0.603,8.888 0.844,8.607 1.118,8.358 1.42,8.144 1.746,7.969 2.09,7.836 2.449,7.745 2.816,7.7 3.001,7.7 7.001,7.7 7.237,7.7 7.703,7.774 8.152,7.921 8.572,8.135 8.954,8.413 9.288,8.746 9.565,9.128 9.779,9.549 9.925,9.998 9.999,10.464 9.999,10.936 9.925,11.402 9.779,11.851 9.565,12.272 9.288,12.654 8.954,12.987 8.572,13.265 8.152,13.479 7.703,13.626 7.237,13.7 7.001,13.7 3.001,13.7 2.816,13.7 2.449,13.655 2.09,13.564 1.746,13.431 1.42,13.256 1.118,13.042 0.844,12.793 0.603,12.512 0.501,12.358
Bottom Layer:
  region: -0.5,9.042 -0.602,8.888 -0.843,8.607 -1.116,8.358 -1.418,8.144 -1.744,7.969 -2.089,7.836 -2.448,7.745 -2.815,7.7 -3,7.7 -7,7.7 -7.236,7.7 -7.703,7.774 -8.152,7.92 -8.572,8.134 -8.954,8.412 -9.288,8.746 -9.566,9.128 -9.78,9.548 -9.926,9.997 -10,10.464 -10,10.936 -9.926,11.402 -9.78,11.852 -9.566,12.272 -9.288,12.654 -8.954,12.988 -8.572,13.266 -8.152,13.48 -7.703,13.626 -7.236,13.7 -7,13.7 -3,13.7 -2.815,13.7 -2.448,13.655 -2.089,13.564 -1.744,13.431 -1.418,13.256 -1.116,13.042 -0.843,12.793 -0.602,12.512 -0.5,12.358
  region: 0.501,9.042 0.603,8.888 0.844,8.607 1.118,8.358 1.42,8.144 1.746,7.969 2.09,7.836 2.449,7.745 2.816,7.7 3.001,7.7 7.001,7.7 7.237,7.7 7.703,7.774 8.152,7.921 8.572,8.135 8.954,8.413 9.288,8.746 9.565,9.128 9.779,9.549 9.925,9.998 9.999,10.464 9.999,10.936 9.925,11.402 9.779,11.851 9.565,12.272 9.288,12.654 8.954,12.987 8.572,13.265 8.152,13.479 7.703,13.626 7.237,13.7 7.001,13.7 3.001,13.7 2.816,13.7 2.449,13.655 2.09,13.564 1.746,13.431 1.42,13.256 1.118,13.042 0.844,12.793 0.603,12.512 0.501,12.358
Top Overlay:
  circle w0.25: c-1.91,-12 r0.125
  lines w0.2: -5.05,-7.6 5.05,-7.6 5.05,5.5 -5.05,5.5 -5.05,-7.6
Board Outline:
  lines w0.2: -10.1,-11.55 10.1,-11.55 10.1,13.8 -10.1,13.8 -10.1,-11.55
Mechanical 15:
  lines w0.1: -0.5,0 0.5,0 ; 0,-0.5 0,0.5
  lines w0.2: -10.1,-11.55 10.1,-11.55 10.1,13.8 -10.1,13.8 -10.1,-11.55
ASM Top:
  lines w0.2: -5.05,-7.6 -5.05,5.5 5.05,5.5 5.05,-7.6 -5.05,-7.6
  text ".Designator" at 0,1.313 h1
3D body "IC_Allegro_MicroSystems_LLC_ACS770LCB-050B-PFF-T_eec.STEP": height 7.1, standoff -3.53, extent -7,-11.297 7,11.519

## FP-CG33_0L-03 [mm]
pads (2):
  rect 1.45x1.45 hole 0.95 paste-1000 mask+0: 1(-4.9,0)
  round 1.45 hole 0.95 paste-1000 mask+0: 2(4.9,0)
Top Overlay:
  lines w0.2: -3.775,0 -3.1,0 ; 3.1,0 3.775,0 ; -3.1,-4.1 3.1,-4.1 3.1,4.1 -3.1,4.1 -3.1,-4.1
Mechanical 15:
  lines w0.1: -0.5,0 0.5,0 ; 0,-0.5 0,0.5
  lines w0.2: -5.725,-4.2 5.725,-4.2 5.725,4.2 -5.725,4.2 -5.725,-4.2
ASM Top:
  lines w0.2: -5.725,-4.2 -5.725,4.2 5.725,4.2 5.725,-4.2 -5.725,-4.2
  text ".Designator" at 0,0.188 h1
3D body "Diode_Littelfuse_Inc_CG33_0L-03_eec.STEP": height 8.2, standoff -4, extent -5.3,-4.1 5.3,4.1

## FP-PG-TSDSON-8-MFG [mm]
pads (3):
  rect 1.64x0.9 smd paste-1000 mask-1000: 1-2-3(-0.325,-1.45)
  rect 0.34x0.9 smd paste-1000 mask+0: 4(0.975,-1.45)
  rect 2.29x2.36 smd paste-1000 mask-1000: 5-6-7-8(0,0.7)
Top Overlay:
  circle w0.25: c-0.975,-2.5 r0.125
  lines w0.2: -1.52,-1.7 -1.7,-1.7 -1.7,1.7 -1.52,1.7 ; 1.52,-1.7 1.7,-1.7 1.7,1.7 1.52,1.7
Top Paste:
  rectangle: -0.225,-1.395 0.445,-1.045
  rectangle: -1.095,-1.395 -0.425,-1.045
  rectangle: 0.205,-1.845 0.445,-1.545
  rectangle: -0.445,-1.845 -0.205,-1.545
  rectangle: -1.095,-1.845 -0.855,-1.545
  rectangle: -0.545,-0.35 0.545,1.05
  rectangle: 0.855,-0.35 1.095,1.05
  rectangle: -1.095,-0.35 -0.855,1.05
  rectangle: -1.095,1.25 -0.855,1.85
  rectangle: 0.855,1.25 1.095,1.85
  rectangle: 0.205,1.25 0.445,1.85
  rectangle: -0.445,1.25 -0.205,1.85
  rectangle: 0.855,-1.85 1.095,-1.15
Top Solder:
  region: -1.145,-1 -1.145,-1.9 -0.805,-1.9 -0.805,-1.45 -0.495,-1.45 -0.495,-1.9 -0.155,-1.9 -0.155,-1.45 0.155,-1.45 0.155,-1.9 0.495,-1.9 0.495,-1
  region: -1.145,1.88 -1.145,-0.48 1.145,-0.48 1.145,1.88 0.805,1.88 0.805,1.23 0.495,1.23 0.495,1.88 0.155,1.88 0.155,1.23 -0.155,1.23 -0.155,1.88 -0.495,1.88 -0.495,1.23 -0.805,1.23 -0.805,1.88
Mechanical 13:
  lines w0.2: -1.7,-1.7 -1.7,1.7 1.7,1.7 1.7,-1.7 -1.7,-1.7
Mechanical 15:
  lines w0.2: -1.8,-2 -1.8,1.98 1.8,1.98 1.8,-2 -1.8,-2
Mechanical 16:
  lines w0.1: -0.5,0 0.5,0 ; 0,-0.5 0,0.5
ASM Top:
  text ".designator" at 0,0.178 h0.8
3D body "Trans_Infineon_IPZ40N04S5L7R4ATMA1_eec.STEP": height 1.15, standoff 0, extent -1.651,-1.652 1.651,1.651

## FP-SOT1426-1-MFG [mm]
pads (33):
  rect 0.9x0.29 smd paste-1000 mask+0: 1(-2.55,1.75) 2(-2.55,1.25) 3(-2.55,0.75) 4(-2.55,0.25) 5(-2.55,-0.25) 6(-2.55,-0.75) 7(-2.55,-1.25) 8(-2.55,-1.75) 17(2.55,-1.75) 18(2.55,-1.25) 19(2.55,-0.75) 20(2.55,-0.25) 21(2.55,0.25) 22(2.55,0.75) 23(2.55,1.25) 24(2.55,1.75)
  rect 0.29x0.9 smd paste-1000 mask+0: 9(-1.75,-2.55) 10(-1.25,-2.55) 11(-0.75,-2.55) 12(-0.25,-2.55) 13(0.25,-2.55) 14(0.75,-2.55) 15(1.25,-2.55) 16(1.75,-2.55) 25(1.75,2.55) 26(1.25,2.55) 27(0.75,2.55) 28(0.25,2.55) 29(-0.25,2.55) 30(-0.75,2.55) 31(-1.25,2.55) 32(-1.75,2.55)
  rect 3x3 smd paste-1000 mask+0: 33(0,0)
Top Overlay:
  circle w0.25: c-3.75,1.72 r0.125
  lines w0.2: -2.55,-2.27 -2.55,-2.55 -2.27,-2.55 ; -2.55,2.27 -2.55,2.55 -2.27,2.55 ; 2.27,-2.55 2.55,-2.55 2.55,-2.27 ; 2.27,2.55 2.55,2.55 2.55,2.27
Top Paste:
  rectangle: -2.975,1.63 -2.125,1.87
  rectangle: -2.975,1.13 -2.125,1.37
  rectangle: -2.975,0.63 -2.125,0.87
  rectangle: -2.975,0.13 -2.125,0.37
  rectangle: -2.975,-0.37 -2.125,-0.13
  rectangle: -2.975,-0.87 -2.125,-0.63
  rectangle: -2.975,-1.37 -2.125,-1.13
  rectangle: -2.975,-1.87 -2.125,-1.63
  rectangle: 2.125,-1.87 2.975,-1.63
  rectangle: 2.125,-1.37 2.975,-1.13
  rectangle: 2.125,-0.87 2.975,-0.63
  rectangle: 2.125,-0.37 2.975,-0.13
  rectangle: 2.125,0.13 2.975,0.37
  rectangle: 2.125,0.63 2.975,0.87
  rectangle: 2.125,1.13 2.975,1.37
  rectangle: 2.125,1.63 2.975,1.87
  rectangle: -1.87,-2.975 -1.63,-2.125
  rectangle: -1.37,-2.975 -1.13,-2.125
  rectangle: -0.87,-2.975 -0.63,-2.125
  rectangle: -0.37,-2.975 -0.13,-2.125
  rectangle: 0.13,-2.975 0.37,-2.125
  rectangle: 0.63,-2.975 0.87,-2.125
  rectangle: 1.13,-2.975 1.37,-2.125
  rectangle: 1.63,-2.975 1.87,-2.125
  rectangle: 1.63,2.125 1.87,2.975
  rectangle: 1.13,2.125 1.37,2.975
  rectangle: 0.63,2.125 0.87,2.975
  rectangle: 0.13,2.125 0.37,2.975
  rectangle: -0.37,2.125 -0.13,2.975
  rectangle: -0.87,2.125 -0.63,2.975
  rectangle: -1.37,2.125 -1.13,2.975
  rectangle: -1.87,2.125 -1.63,2.975
  rectangle: -0.9,0.2 -0.2,0.9
  rectangle: 0.2,0.2 0.9,0.9
  rectangle: -0.9,-0.9 -0.2,-0.2
  rectangle: 0.2,-0.9 0.9,-0.2
Mechanical 15:
  lines w0.2: -3.1,-3.1 3.1,-3.1 3.1,3.1 -3.1,3.1 -3.1,-3.1
Mechanical 16:
  lines w0.1: -0.5,0 0.5,0 ; 0,-0.5 0,0.5
ASM Top:
  lines w0.2: -2.55,-2.55 -2.55,2.55 2.55,2.55 2.55,-2.55 -2.55,-2.55
  text ".designator" at 0,0 h0.8
3D body "IC_NXP_Semiconductors_PCAL6524HEAZ_eec.STEP": height 0.6, standoff 0, extent -2.5,-2.5 2.5,2.5

## GDT-1812 [mm]
pads (2):
  rect 0.953x3.603 smd paste+0 mask+0: 1(-2.325,0) 2(2.325,0)
Top Overlay:
  lines w0.2: -1.548,-1.801 1.549,-1.801 ; -1.548,1.802 1.549,1.802
Mechanical 15:
  lines w0.1: -0.5,0 0.5,0 ; 0,-0.5 0,0.5
  lines w0.2: -3.051,-2.051 3.052,-2.051 3.052,2.052 -3.051,2.052 -3.051,-2.051
ASM Top:
  lines w0.2: -2.25,-1.6 -2.25,1.6 2.25,1.6 2.25,-1.6 -2.25,-1.6
  text ".Designator" at 0,0.188 h1
3D body "2051-xx-sm.stp": height 2.71, standoff 0.01, extent -2.25,-1.6 2.25,1.6